# Altium footprint library ICs.PcbLib: 31 footprints (part 2 of 2)
Each footprint in its own frame and in the unit in brackets; x right, y up, seen from the top. Pads: shape width x height; smd on the part's side, far side on the other; paste and mask are expansions set on the pad; w line width, h text height; cw(c..) or ccw(c..) is an arc to the next point about the centre after c.
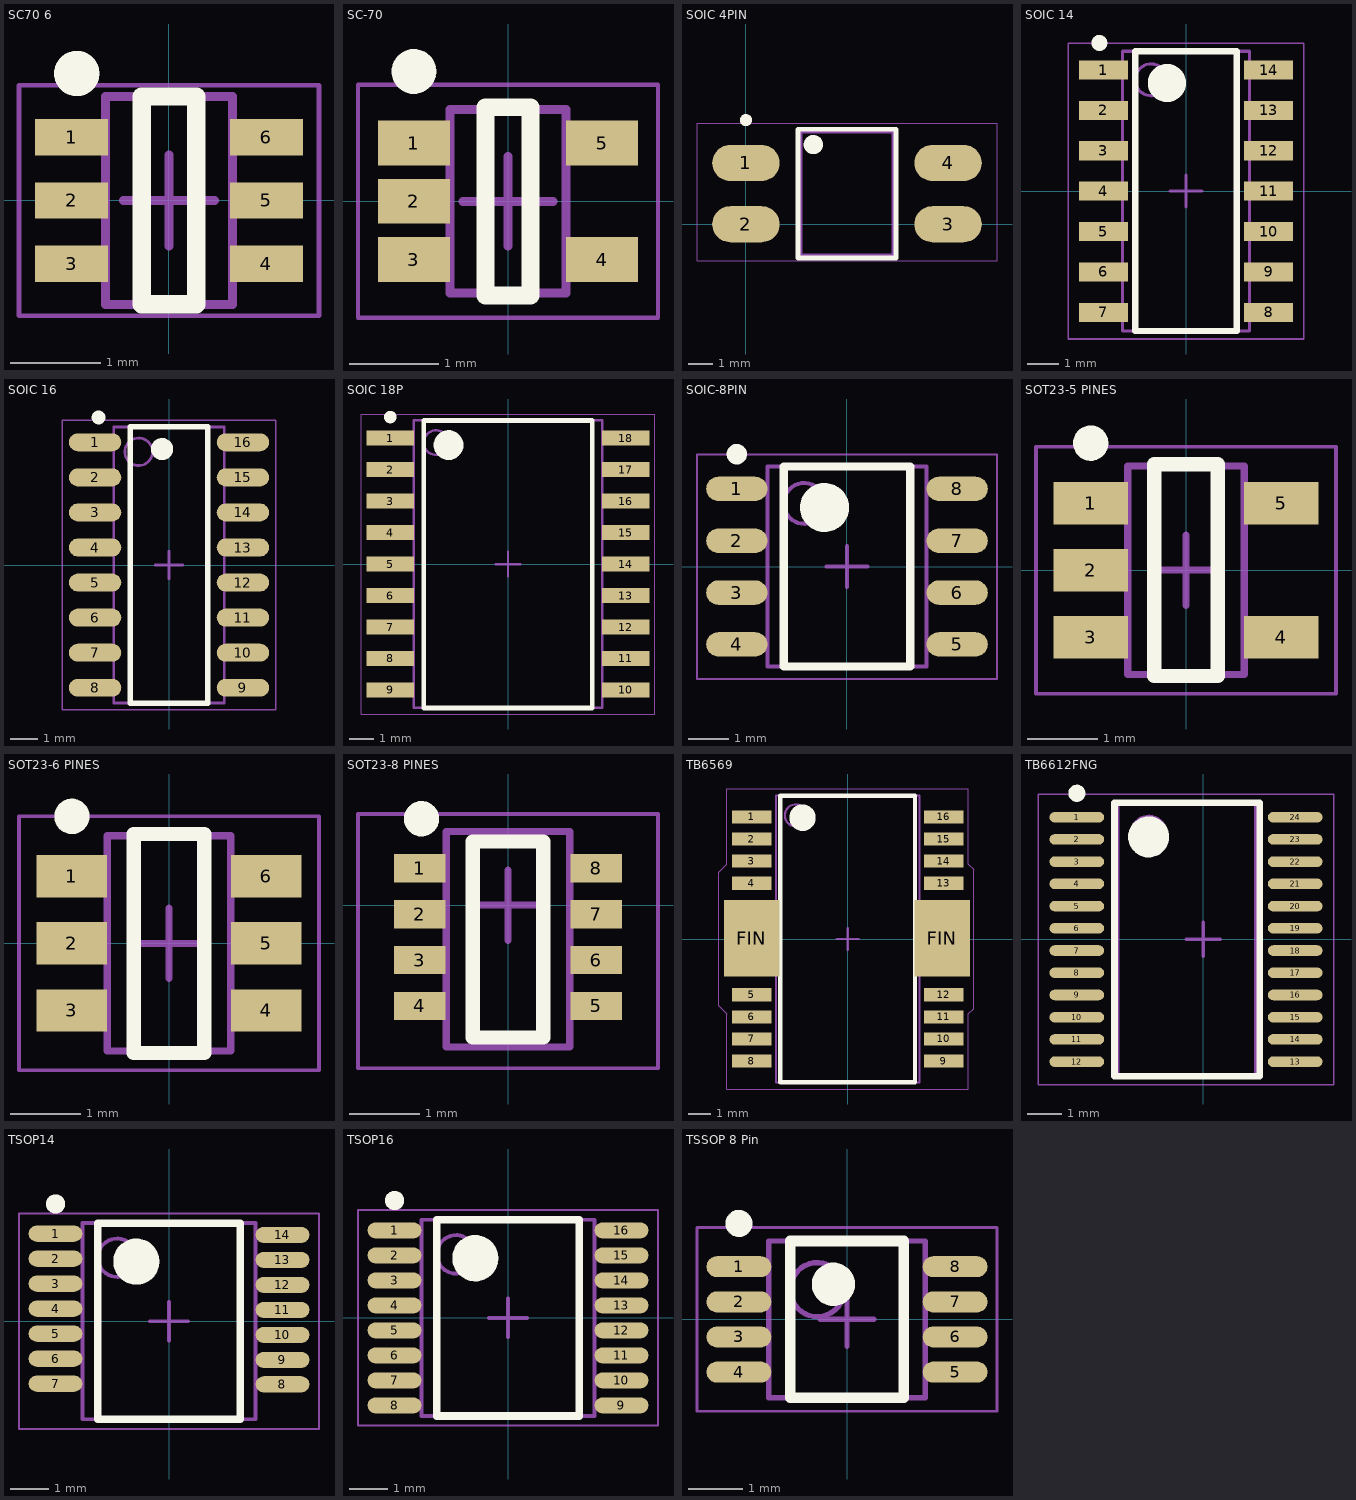
[diagram p1: the footprints below, top view; thin cyan lines are the x and y axes]

## SC70 6 [mm] "6 Pin SMD SC70"
height 1.1
pads (6):
  rect 0.8x0.4 smd: 1(-1.073,0.696) 2(-1.073,0) 3(-1.073,-0.696) 4(1.073,-0.696) 5(1.073,0) 6(1.073,0.696)
Top Overlay:
  circle w0.25: c-1.016,1.397 r0.125
  lines w0.2: -0.3,-1.143 0.3,-1.143 0.3,1.143 -0.3,1.143 -0.3,-1.143
Mechanical 13:
  lines w0.1: -0.7,-1.143 -0.7,1.143 0.7,1.143 0.7,-1.143 -0.7,-1.143
Mechanical 15:
  lines w0.05: -1.651,-1.27 -1.651,1.27 1.651,1.27 1.651,-1.27 -1.651,-1.27
  lines w0.1: -0.5,0 0.5,0 ; 0,-0.5 0,0.5
3D body "SC70-6.step": height 0.92, standoff -0.03, extent -1.05,-1 1.05,1

## SC-70 [mm] "SC-70 Similar a SOT23 usado en reguladores microchip"
height 1.1
pads (5):
  rect 0.8x0.5 smd: 1(-1.05,0.65) 2(-1.05,0) 3(-1.05,-0.65) 4(1.05,-0.65) 5(1.05,0.65)
Top Overlay:
  circle w0.25: c-1.05,1.45 r0.125
  lines w0.2: -0.25,-1.05 0.25,-1.05 0.25,1.05 -0.25,1.05 -0.25,-1.05
Mechanical 13:
  lines w0.1: -0.65,-1.025 -0.65,1.025 0.65,1.025 0.65,-1.025 -0.65,-1.025
Mechanical 15:
  lines w0.05: -1.675,-1.3 -1.675,1.3 1.675,1.3 1.675,-1.3 -1.675,-1.3
  lines w0.1: -0.5,0 0.5,0 ; 0,-0.5 0,0.5
3D body "SC-70.step": height 1.1, standoff 0, extent -1.05,-1.025 1.05,1.025

## SOIC 4PIN [mm] "SOIC, 4-Leads, Body 5.00x4.00mm, Pitch 1.27mm, IPC Medium Density"
height 2
pads (4):
  oval 2.8x1.5 smd: 1(0,2.54) 2(0,0) 3(8.382,0) 4(8.382,2.54)
Top Overlay:
  circle w0.4: c2.794,3.302 r0.2
  circle w0.25: c0,4.318 r0.125
  lines w0.2: 2.159,-1.397 6.223,-1.397 6.223,3.937 2.159,3.937 2.159,-1.397
Mechanical 13:
  lines w0.1: 2.286,-1.27 6.096,-1.27 6.096,3.81 2.286,3.81 2.286,-1.27
Mechanical 15:
  lines w0.05: -2.032,-1.524 10.414,-1.524 10.414,4.191 -2.032,4.191 -2.032,-1.524
  lines w0.1: -0.5,0 0.5,0 ; 0,-0.5 0,0.5
3D body "SOP 4.step": height 3.85, standoff 0.03, extent -0.736,-1.02 9.144,3.56

## SOIC 14 [mm] "SOIC, 14-Leads, Body 8.65x3.90mm, Pitch 1.27mm, IPC Medium Density"
height 1.75
pads (14):
  rect 1.55x0.6 smd: 1(-2.598,3.81) 2(-2.598,2.54) 3(-2.598,1.27) 4(-2.598,0) 5(-2.598,-1.27) 6(-2.598,-2.54) 7(-2.598,-3.81) 8(2.598,-3.81) 9(2.598,-2.54) 10(2.598,-1.27) 11(2.598,0) 12(2.598,1.27) 13(2.598,2.54) 14(2.598,3.81)
Top Overlay:
  circle w0.25: c-2.725,4.66 r0.125
  circle w0.6: c-0.6,3.4 r0.3
  lines w0.2: -1.6,-4.4 -1.6,4.4 1.6,4.4 1.6,-4.4 -1.6,-4.4
Mechanical 13:
  circle w0.1: c-1.1,3.5 r0.5
  lines w0.1: -2,-4.4 -2,4.4 2,4.4 2,-4.4 -2,-4.4
Mechanical 15:
  lines w0.05: -3.7,-4.65 -3.7,4.65 3.7,4.65 3.7,-4.65 -3.7,-4.65
  lines w0.1: -0.5,0 0.5,0 ; 0,-0.5 0,0.5
3D body "SOIC 14.step": height 1.75, standoff 0, extent -3,-4.4 3,4.4

## SOIC 16 [mm] "SOIC 16P 1.27mm"
height 2
pads (16):
  oval 1.9x0.65 smd: 1(-2.677,4.445) 2(-2.677,3.175) 3(-2.677,1.905) 4(-2.677,0.635) 5(-2.677,-0.635) 6(-2.677,-1.905) 7(-2.677,-3.175) 8(-2.677,-4.445) 9(2.677,-4.445) 10(2.677,-3.175) 11(2.677,-1.905) 12(2.677,-0.635) 13(2.677,0.635) 14(2.677,1.905) 15(2.677,3.175) 16(2.677,4.445)
Top Overlay:
  circle w0.4: c-0.25,4.2 r0.2
  circle w0.25: c-2.55,5.345 r0.125
  lines w0.2: -1.397,-5 1.397,-5 1.397,5 -1.397,5 -1.397,-5
Mechanical 13:
  circle w0.1: c-1.1,4.1 r0.5
  lines w0.1: -2,-5 2,-5 2,5 -2,5 -2,-5
Mechanical 15:
  lines w0.05: -3.875,-5.25 3.875,-5.25 3.875,5.25 -3.875,5.25 -3.875,-5.25
  lines w0.1: -0.5,0 0.5,0 ; 0,-0.5 0,0.5
3D body "SOIC 16.step": height 1.4, standoff 0, extent -3,-4.95 3,4.95

## SOIC 18P [mm] "SOIC, 18-Leads, Body 11.55x7.50mm, Pitch 1.27mm, IPC Medium Density"
height 2.65
pads (18):
  rect 1.9x0.6 smd: 1(-4.75,5.08) 2(-4.75,3.81) 3(-4.75,2.54) 4(-4.75,1.27) 5(-4.75,0) 6(-4.75,-1.27) 7(-4.75,-2.54) 8(-4.75,-3.81) 9(-4.75,-5.08) 10(4.75,-5.08) 11(4.75,-3.81) 12(4.75,-2.54) 13(4.75,-1.27) 14(4.75,0) 15(4.75,1.27) 16(4.75,2.54) 17(4.75,3.81) 18(4.75,5.08)
Top Overlay:
  circle w0.25: c-4.75,5.93 r0.125
  circle w0.6: c-2.4,4.8 r0.3
  lines w0.2: -3.4,-5.8 -3.4,5.8 3.4,5.8 3.4,-5.8 -3.4,-5.8
Mechanical 13:
  circle w0.1: c-2.9,4.9 r0.5
  lines w0.1: -3.8,-5.8 -3.8,5.8 3.8,5.8 3.8,-5.8 -3.8,-5.8
Mechanical 15:
  lines w0.05: -5.925,-6.05 -5.925,6.05 5.925,6.05 5.925,-6.05 -5.925,-6.05
  lines w0.1: -0.5,0 0.5,0 ; 0,-0.5 0,0.5
3D body "SO-18W.STEP": height 2.48, standoff 0, extent -5.155,-5.79 5.155,5.79

## SOIC-8PIN [mm] "IC SOIC 8 PIN SMD"
height 1.75
pads (8):
  oval 1.5x0.6 smd: 1(-2.7,1.905) 2(-2.7,0.635) 3(-2.7,-0.635) 4(-2.7,-1.905) 5(2.7,-1.905) 6(2.7,-0.635) 7(2.7,0.635) 8(2.7,1.905)
Top Overlay:
  circle w0.6: c-0.55,1.45 r0.3
  circle w0.25: c-2.7,2.755 r0.125
  lines w0.2: -1.55,-2.45 1.55,-2.45 1.55,2.45 -1.55,2.45 -1.55,-2.45
Mechanical 13:
  circle w0.1: c-1.05,1.55 r0.5
  lines w0.1: -1.95,-2.45 1.95,-2.45 1.95,2.45 -1.95,2.45 -1.95,-2.45
Mechanical 15:
  lines w0.05: -3.675,-2.75 3.675,-2.75 3.675,2.75 -3.675,2.75 -3.675,-2.75
  lines w0.1: -0.5,0 0.5,0 ; 0,-0.5 0,0.5
3D body "SOIC-8PIN.step": height 1.75, standoff 0, extent -3.024,-2.45 3.024,2.45

## SOT23-5 PINES [mm] "SOT23, 5-Leads, Body 2.88x2.83mm, Pitch 0.95mm, IPC Medium Density"
height 1.4
pads (5):
  rect 1.05x0.6 smd: 1(-1.35,0.95) 2(-1.35,0) 3(-1.35,-0.95) 4(1.35,-0.95) 5(1.35,0.95)
Top Overlay:
  circle w0.25: c-1.35,1.8 r0.125
  lines w0.2: -0.45,-1.5 0.45,-1.5 0.45,1.5 -0.45,1.5 -0.45,-1.5
Mechanical 13:
  lines w0.1: -0.825,-1.475 -0.825,1.475 0.825,1.475 0.825,-1.475 -0.825,-1.475
Mechanical 15:
  lines w0.05: -2.125,-1.75 -2.125,1.75 2.125,1.75 2.125,-1.75 -2.125,-1.75
  lines w0.1: -0.5,0 0.5,0 ; 0,-0.5 0,0.5
3D body "SOT23-5 PINES.step": height 1.4, standoff 0, extent -1.5,-1.475 1.5,1.475

## SOT23-6 PINES [mm] "SOT23, 6-Leads, Body 2.93x2.83mm, Pitch 0.95mm, IPC Medium Density"
height 1.4
pads (6):
  rect 1x0.6 smd: 1(-1.375,0.95) 2(-1.375,0) 3(-1.375,-0.95) 4(1.375,-0.95) 5(1.375,0) 6(1.375,0.95)
Top Overlay:
  circle w0.25: c-1.375,1.8 r0.125
  lines w0.2: -0.5,-1.55 -0.5,1.55 0.5,1.55 0.5,-1.55 -0.5,-1.55
Mechanical 13:
  lines w0.1: -0.875,-1.525 0.875,-1.525 0.875,1.525 -0.875,1.525 -0.875,-1.525
Mechanical 15:
  lines w0.05: -2.125,-1.8 2.125,-1.8 2.125,1.8 -2.125,1.8 -2.125,-1.8
  lines w0.1: -0.5,0 0.5,0 ; 0,-0.5 0,0.5
3D body "SOT23-6 PINES.step": height 1.4, standoff 0, extent -1.5,-1.525 1.5,1.525

## SOT23-8 PINES [mm] "SOT23, 8-Leads, Body 2.93x2.83mm, Pitch 0.95mm, IPC Medium Density"
height 1.4
pads (8):
  rect 0.73x0.4 smd: 1(-1.248,0.523) 2(-1.248,-0.127) 3(-1.248,-0.777) 4(-1.248,-1.427) 5(1.248,-1.427) 6(1.248,-0.777) 7(1.248,-0.127) 8(1.248,0.523)
Top Overlay:
  circle w0.25: c-1.225,1.225 r0.125
  lines w0.2: -0.5,-1.875 0.5,-1.875 0.5,0.9 -0.5,0.9 -0.5,-1.875
Mechanical 13:
  lines w0.1: -0.875,-2.008 -0.875,1.042 0.875,1.042 0.875,-2.008 -0.875,-2.008
Mechanical 15:
  lines w0.05: -2.125,-2.308 -2.125,1.292 2.125,1.292 2.125,-2.308 -2.125,-2.308
  lines w0.1: -0.5,0 0.5,0 ; 0,-0.5 0,0.5
3D body "SOT-23-8.step": height 1.2, standoff 0, extent -1.4,-1.95 1.4,0.99

## TB6569 [mm] "DRIVER DC MOTOR"
height 2.65
pads (18):
  rect 1.8x0.6 smd: 1(-4.35,5.532) 2(-4.35,4.532) 3(-4.35,3.532) 4(-4.35,2.532) 5(-4.35,-2.532) 6(-4.35,-3.532) 7(-4.35,-4.532) 8(-4.35,-5.532) 9(4.35,-5.532) 10(4.35,-4.532) 11(4.35,-3.532) 12(4.35,-2.532) 13(4.35,2.532) 14(4.35,3.532) 15(4.35,4.532) 16(4.35,5.532)
  rect 2.5x3.45 smd: FIN(-4.35,0.032) FIN(4.286,0.032)
Top Overlay:
  circle w0.6: c-2.05,5.5 r0.3
  lines w0.2: -3.05,-6.5 -3.05,6.5 3.05,6.5 3.05,-6.5 -3.05,-6.5
Mechanical 13:
  circle w0.1: c-2.35,5.6 r0.5
  lines w0.1: -3.25,-6.5 -3.25,6.5 3.25,6.5 3.25,-6.5 -3.25,-6.5
Mechanical 15:
  lines w0.05: -5.842,-3.033 -5.475,-3.4 -5.475,-6.8 5.475,-6.8 5.475,-3.4 5.715,-3.16 5.715,3.16 5.475,3.4 5.475,6.8 -5.475,6.8 -5.475,3.4 -5.842,3.033 -5.842,-3.033
  lines w0.1: -0.5,0 0.5,0 ; 0,-0.5 0,0.5
3D body "TB6569FG.step": height 2.4, standoff 0, extent -4.8,-6.5 4.8,6.5

## TB6612FNG [mm] "SOP, 24-Leads, Body 8.00x5.00mm, Pitch 0.65mm, IPC Medium Density"
height 2
pads (24):
  oval 1.6x0.31 smd: 1(-3.7,3.575) 2(-3.7,2.925) 3(-3.7,2.275) 4(-3.7,1.625) 5(-3.7,0.975) 6(-3.7,0.325) 7(-3.7,-0.325) 8(-3.7,-0.975) 9(-3.7,-1.625) 10(-3.7,-2.275) 11(-3.7,-2.925) 12(-3.7,-3.575) 13(2.684,-3.575) 14(2.684,-2.925) 15(2.684,-2.275) 16(2.684,-1.625) 17(2.684,-0.975) 18(2.684,-0.325) 19(2.684,0.325) 20(2.684,0.975) 21(2.684,1.625) 22(2.684,2.275) 23(2.684,2.925) 24(2.684,3.575)
Top Overlay:
  circle w0.25: c-3.7,4.275 r0.125
  circle w0.6: c-1.6,3 r0.3
  lines w0.2: -2.6,-4 -2.6,4 1.651,4 1.651,-4 -2.6,-4
Mechanical 13:
  circle w0.1: c-1.6,3.1 r0.5
  lines w0.1: -2.5,-4 -2.5,4 1.524,4 1.524,-4 -2.5,-4
Mechanical 15:
  lines w0.05: -4.826,-4.25 -4.826,4.25 3.81,4.25 3.81,-4.25 -4.826,-4.25
  lines w0.1: -0.5,0 0.5,0 ; 0,-0.5 0,0.5
3D body "TSSOP-24.step": height 1.2, standoff 0, extent -3.783,-3.963 2.767,3.937

## TSOP14 [mm] "TSOP, 14-Leads, Pitch 0.65mm, IPC Medium Density"
height 1.1
pads (14):
  oval 1.4x0.42 smd: 1(-2.95,2.275) 2(-2.95,1.625) 3(-2.95,0.975) 4(-2.95,0.325) 5(-2.95,-0.325) 6(-2.95,-0.975) 7(-2.95,-1.625) 8(2.95,-1.64) 9(2.95,-1.005) 10(2.95,-0.355) 11(2.95,0.295) 12(2.95,0.945) 13(2.95,1.595) 14(2.95,2.245)
Top Overlay:
  circle w0.6: c-0.85,1.55 r0.3
  circle w0.25: c-2.95,3.05 r0.125
  lines w0.2: -1.85,-2.55 1.85,-2.55 1.85,2.55 -1.85,2.55 -1.85,-2.55
Mechanical 13:
  circle w0.1: c-1.35,1.65 r0.5
  lines w0.1: -2.25,-2.55 2.25,-2.55 2.25,2.55 -2.25,2.55 -2.25,-2.55
Mechanical 15:
  lines w0.05: -3.9,-2.8 3.9,-2.8 3.9,2.8 -3.9,2.8 -3.9,-2.8
  lines w0.1: -0.5,0 0.5,0 ; 0,-0.5 0,0.5
3D body "SSOP14-P065.STEP": height 1.73, standoff -0.08, extent -2.867,-2.164 3.133,2.836

## TSOP16 [mm] "TSOP, 16-Leads, Body 5.00x4.40mm, Pitch 0.65mm, IPC Medium Density"
height 1.1
pads (16):
  oval 1.4x0.42 smd: 1(-2.95,2.275) 2(-2.95,1.625) 3(-2.95,0.975) 4(-2.95,0.325) 5(-2.95,-0.325) 6(-2.95,-0.975) 7(-2.95,-1.625) 8(-2.95,-2.275) 9(2.95,-2.275) 10(2.95,-1.625) 11(2.95,-0.975) 12(2.95,-0.325) 13(2.95,0.325) 14(2.95,0.975) 15(2.95,1.625) 16(2.95,2.275)
Top Overlay:
  circle w0.25: c-2.95,3.05 r0.125
  circle w0.6: c-0.85,1.55 r0.3
  lines w0.2: -1.85,-2.55 -1.85,2.55 1.85,2.55 1.85,-2.55 -1.85,-2.55
Mechanical 13:
  circle w0.1: c-1.35,1.65 r0.5
  lines w0.1: -2.25,-2.55 -2.25,2.55 2.25,2.55 2.25,-2.55 -2.25,-2.55
Mechanical 15:
  lines w0.05: -3.9,-2.8 -3.9,2.8 3.9,2.8 3.9,-2.8 -3.9,-2.8
  lines w0.1: -0.5,0 0.5,0 ; 0,-0.5 0,0.5
3D body "TSOP16 .step": height 1.1, standoff 0, extent -3.2,-2.55 3.2,2.55

## TSSOP 8 Pin [mm] "TSOP, 8-Leads, Body 3.00x3.00mm, Pitch 0.65mm, IPC Medium Density"
height 1.2
pads (8):
  oval 1.2x0.39 smd: 1(-2,0.975) 2(-2,0.325) 3(-2,-0.325) 4(-2,-0.975) 5(2,-0.975) 6(2,-0.325) 7(2,0.325) 8(2,0.975)
Top Overlay:
  circle w0.4: c-0.25,0.65 r0.2
  circle w0.25: c-2,1.775 r0.125
  lines w0.2: -1.05,-1.45 1.05,-1.45 1.05,1.45 -1.05,1.45 -1.05,-1.45
Mechanical 13:
  circle w0.1: c-0.55,0.55 r0.5
  lines w0.1: -1.45,-1.45 1.45,-1.45 1.45,1.45 -1.45,1.45 -1.45,-1.45
Mechanical 15:
  lines w0.05: -2.775,-1.7 2.775,-1.7 2.775,1.7 -2.775,1.7 -2.775,-1.7
  lines w0.1: -0.5,0 0.5,0 ; 0,-0.5 0,0.5
3D body "TSSOP 8 Pin.step": height 1.2, standoff 0, extent -2,-1.45 2,1.45